# Altium footprint library self_pcblib v1.8.6.PcbLib: 164 footprints (part 9 of 11)
Each footprint in its own frame and in the unit in brackets; x right, y up, seen from the top. Pads: shape width x height; smd on the part's side, far side on the other; paste and mask are expansions set on the pad; w line width, h text height; cw(c..) or ccw(c..) is an arc to the next point about the centre after c.
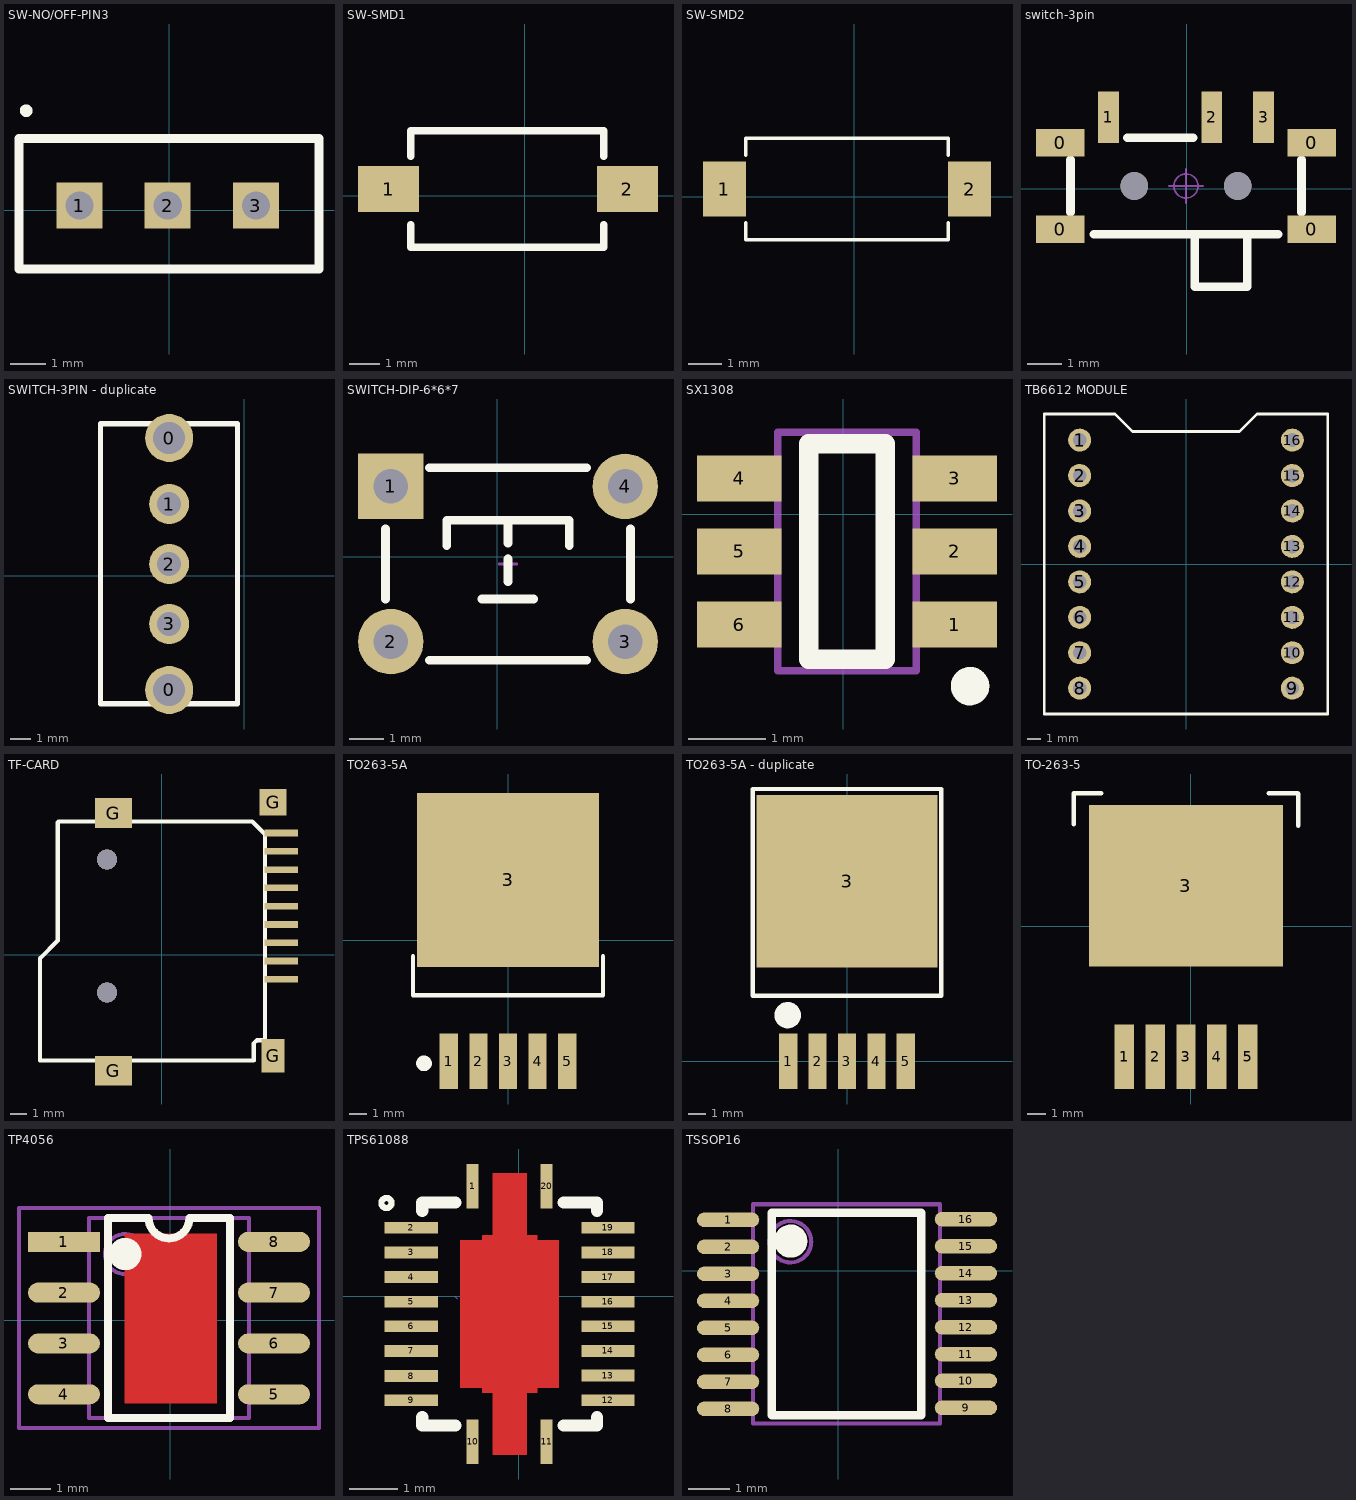
[diagram p8: the footprints below, top view; thin cyan lines are the x and y axes]

## straight-2x5pin [mm]

## SW-NO/OFF-PIN3 [mm]
pads (3):
  rect 1.3x1.3 hole 0.8: 1(-2.547,0.126) 2(-0.047,0.126) 3(2.453,0.126)
Top Overlay:
  circle w0.254: c-4.057,2.814 r0.051
  lines w0.254: -4.26,-1.673 4.24,-1.673 4.24,2.027 -4.26,2.027 -4.26,-1.673
3D body "SW-No_OFF.step": height 4.32, standoff -9.73, extent -5.39,-2.672 5.608,2.916

## SW-SMD1 [mm]
pads (2):
  rect 2x1.5 smd: 1(-4.445,0.229) 2(3.355,0.229)
Top Overlay:
  lines w0.254: -3.72,-0.94 -3.72,-1.671 2.58,-1.671 2.58,-0.94 ; -3.72,1.295 -3.72,2.129 2.58,2.129 2.58,1.295
3D body "SMD按键.STEP": height 2.5, standoff 0, extent -4.504,-1.716 3.386,2.134

## SW-SMD2 [mm]
pads (2):
  rect 1.3x1.651 smd: 1(-3.901,0.235) 2(3.465,0.235)
Top Overlay:
  lines w0.1: -3.266,-0.781 -3.266,-1.289 2.83,-1.289 2.83,-0.781 ; -3.266,1.251 -3.266,1.759 2.83,1.759 2.83,1.251
3D body "按键.STEP": height 1.9, standoff 0, extent -3.518,-1.314 3.082,1.886

## switch-3pin [mm]
pads (9):
  rect 1.4x0.8 smd: 0(-3.675,-1.174) 0(-3.675,1.326) 0(3.625,-1.174) 0(3.625,1.326)
  rect 0.6x1.5 smd: 1(-2.275,2.072) 2(0.725,2.072) 3(2.225,2.072)
  round 0.8 hole 0.8: " "(-1.525,0.076) " "(1.475,0.076)
Top Overlay:
  lines w0.254: -3.375,-0.686 -3.375,0.838 ; -2.692,-1.321 2.642,-1.321 ; -1.724,1.473 0.181,1.473 ; 0.229,-1.324 0.229,-2.845 1.753,-2.845 1.753,-1.324 ; 3.325,-0.686 3.325,0.838
Mechanical 15:
  circle w0.05: c-0.025,0.076 r0.35
  lines w0.05: -0.525,0.076 0.475,0.076 ; -0.025,-0.424 -0.025,0.576
3D body "MSK-12C01-07.STEP": height 1.5, standoff -0.5, extent -3.945,-2.824 3.895,2.476

## SWITCH-3PIN - duplicate [mm] "开关"
pads (5):
  round 2.4 hole 1.6: 0(-3.763,-5.712) 0(-3.763,6.888)
  round 2 hole 1.2: 1(-3.763,3.588) 2(-3.763,0.588) 3(-3.763,-2.412)
Top Overlay:
  lines w0.254: -7.2,-6.4 -0.342,-6.4 -0.342,7.6 -7.2,7.6 -7.2,-6.4
3D body "SW-SLB12814.STEP": height 9.65, standoff -2.6, extent -6.9,-6.4 -0.7,7.6

## SWITCH-DIP-6*6*7 [mm]
pads (4):
  rect 1.9x1.9 hole 1: 1(-3.095,2.047)
  round 1.9 hole 1: 2(-3.095,-2.453) 3(3.705,-2.453) 4(3.705,2.047)
Top Overlay:
  lines w0.254: -3.251,-1.219 -3.251,0.813 ; -1.981,-2.997 2.591,-2.997 ; -1.981,2.591 2.591,2.591 ; -1.473,0.33 -1.473,1.067 2.083,1.067 2.083,0.33 ; -0.457,-1.219 1.041,-1.219 ; 0.305,-0.711 0.305,-0.051 ; 0.305,0.406 0.305,1.067 ; 3.861,-1.219 3.861,0.813
Bottom Overlay:
  lines w0.254: -1.981,-2.489 2.591,-2.489 ; -1.981,2.083 2.591,2.083
Mechanical 15:
  lines w0.076: 0.051,-0.203 0.559,-0.203 ; 0.305,-0.457 0.305,0.051
3D body "TSW DIP-6x6x7.STEP": height 6.95, standoff -3.45, extent -3.801,-3.203 4.411,2.797

## SX1308 [mm]
pads (6):
  rect 1.1x0.6 smd: 1(1.451,-1.433) 2(1.451,-0.483) 3(1.451,0.467) 4(-1.349,0.467) 5(-1.349,-0.483) 6(-1.349,-1.433)
Top Overlay:
  circle w0.25: c1.651,-2.233 r0.125
  lines w0.254: -0.449,-1.883 -0.449,0.917 0.551,0.917 0.551,-1.883 -0.449,-1.883
Mechanical 13:
  lines w0.1: -0.849,-2.033 -0.849,1.067 0.951,1.067 0.951,-2.033 -0.849,-2.033
3D body "User Library-SOT23-6-4.STEP": height 1, standoff -0.1, extent -1.155,-1.933 1.245,0.967

## TB6612 MODULE [mil]
pads (16):
  round 65 hole 39: 1(-300,350) 2(-300,250) 3(-300,150) 4(-300,50) 5(-300,-50) 6(-300,-150) 7(-300,-250) 8(-300,-350) 9(300,-350) 10(300,-250) 11(300,-150) 12(300,-50) 13(300,50) 14(300,150) 15(300,250) 16(300,350)
Top Overlay:
  lines w8: -400,-422.83 400,-422.83 400,423.62 200,423.62 150.79,374.41 -150.79,374.41 -200,423.62 -400,423.62 -400,-422.83

## TF-CARD [mm]
pads (13):
  rect 2x0.4 smd: 1(7.191,-1.488) 2(7.191,-0.388) 3(7.191,0.712) 4(7.191,1.812) 5(7.191,2.912) 6(7.191,4.012) 7(7.191,5.112) 8(7.191,6.212) 9(7.191,7.312)
  rect 2.2x1.8 smd: G(-2.909,-6.988) G(-2.909,8.512)
  rect 1.4x2 smd: G(6.691,-6.088)
  rect 1.6x1.6 smd: G(6.691,9.162)
via -3.309,5.712 diameter 1.2 hole 1.2
via -3.309,-2.288 diameter 1.2 hole 1.2
Top Overlay:
  lines w0.254: -7.329,-6.368 -7.329,-0.226 -6.262,0.841 -6.262,7.953 -6.214,8.001 5.443,8.001 6.205,7.239 6.205,7.112 6.205,-5.153 5.727,-5.153 5.524,-5.356 5.524,-6.372 -7.325,-6.372
3D body "Micro SD.STEP": height 0.1, standoff -2.37, extent -7.227,-7.269 7.983,9.037

## TO263-5A [mm]
pads (6):
  rect 1.05x3.2 smd: 1(-3.425,-6.934) 2(-1.725,-6.934) 3(-0.025,-6.934) 4(1.675,-6.934) 5(3.375,-6.934)
  rect 10.45x10 smd: 3(-0.025,3.48)
Top Overlay:
  circle w0.5: c-4.851,-7.061 r0.2
  lines w0.254: -5.486,-0.897 -5.486,-3.147 5.436,-3.147 5.436,-0.897
3D body "TO263-5A.STEP": height 4.5, standoff 0, extent -5.025,-6.945 4.975,6.383

## TO263-5A - duplicate [mm] "263，5脚晶体管"
pads (6):
  rect 1.05x3.2 smd: 1(-3.4,0) 2(-1.7,0) 3(0,0) 4(1.7,0) 5(3.4,0)
  rect 10.45x10 smd: 3(0,10.414)
Top Overlay:
  circle w0.762: c-3.429,2.667 r0.381
  lines w0.254: -5.461,3.787 5.461,3.787 5.461,6.037 5.461,15.748 -5.461,15.748 -5.461,6.037 -5.461,3.787
3D body "6.STEP": height 4.5, standoff 0, extent -5.047,0.448 4.953,13.776

## TO-263-5 [mil]
pads (6):
  rect 42x140 smd: 1(-144.6,-282.2) 2(-77.6,-282.2) 3(-10.6,-282.2) 4(56.4,-282.2) 5(123.4,-282.2)
  rect 420x350 smd: 3(-10.6,87.8)
Top Overlay:
  lines w10: -253.6,221.8 -253.6,288.8 -194.6,288.8 ; 168.4,288.8 231.4,288.8 232.4,287.8 232.4,217.8
3D body "TO-263-5.step": height 179.92, standoff -0.39, extent -210.6,-315.41 189.4,261.01

## TP4056 [mm]
pads (8):
  rect 1.8x0.5 smd: 1(-2.65,1.956)
  oval 1.8x0.5 smd: 2(-2.65,0.686) 3(-2.65,-0.584) 4(-2.65,-1.854) 5(2.6,-1.854) 6(2.6,-0.584) 7(2.6,0.686) 8(2.6,1.956)
Top Layer:
  rectangle: -1.143,-2.083 1.168,2.159
Top Overlay:
  circle w0.5: c-1.12,1.651 r0.155
  lines w0.2: -1.549,2.551 -1.549,-2.449 1.499,-2.449 1.499,2.551
  lines w0.203: -1.549,2.551 -0.533,2.551 ccw(c-0.025,2.551) -0.025,2.043 ccw(c-0.025,2.551) 0.483,2.551 1.499,2.551
Mechanical 13:
  circle w0.1: c-1.125,1.651 r0.5
  lines w0.1: -2.025,-2.449 1.975,-2.449 1.975,2.551 -2.025,2.551 -2.025,-2.449
Mechanical 15:
  circle w0.05: c-0.025,0.051 r0.35
  lines w0.05: -0.525,0.051 0.475,0.051 ; -0.025,-0.449 -0.025,0.551
  lines w0.1: -3.775,-2.699 3.725,-2.699 3.725,2.801 -3.775,2.801 -3.775,-2.699
3D body "SOP8.STEP": height 1.9, standoff 0, extent -3.029,-2.449 2.978,2.551

## TPS61088 [mm] "12V升压IC"
pads (21):
  rect 0.244x0.914 smd: 1(-0.948,2.27) 10(-0.948,-3) 11(0.576,-3) 20(0.576,2.27)
  rect 1.1x0.244 smd: 2(-2.213,1.413) 3(-2.213,0.905) 4(-2.213,0.397) 5(-2.213,-0.111) 6(-2.213,-0.619) 7(-2.213,-1.127) 8(-2.213,-1.645) 9(-2.213,-2.143) 12(1.841,-2.143) 13(1.841,-1.635) 14(1.841,-1.127) 15(1.841,-0.619) 16(1.841,-0.111) 17(1.841,0.397) 18(1.841,0.905) 19(1.841,1.413)
  round 0 smd: 21(-0.185,-0.363)
Top Layer:
  region: 0.165,2.537 0.165,1.258 0.379,1.255 0.38,1.159 0.83,1.158 0.83,-1.889 0.385,-1.886 0.385,-1.984 0.165,-1.987 0.165,-3.263 -0.535,-3.263 -0.535,-1.984 -0.747,-1.987 -0.747,-1.889 -1.2,-1.889 -1.202,1.159 -0.753,1.159 -0.753,1.257 -0.535,1.256 -0.535,2.537
Top Overlay:
  circle w0.129: c-2.725,1.923 r0.104
  lines w0.254: -1.986,-2.496 -1.986,-2.665 -1.301,-2.665 ; -1.986,1.766 -1.986,1.935 -1.301,1.935 ; 0.929,-2.665 1.614,-2.665 1.614,-2.496 ; 0.929,1.935 1.614,1.935 1.614,1.766
Top Paste:
  region: 0.165,2.537 0.165,1.258 0.379,1.255 0.38,1.159 0.83,1.158 0.83,-1.889 0.385,-1.886 0.385,-1.984 0.165,-1.987 0.165,-3.263 -0.535,-3.263 -0.535,-1.984 -0.747,-1.987 -0.747,-1.889 -1.2,-1.889 -1.202,1.159 -0.753,1.159 -0.753,1.257 -0.535,1.256 -0.535,2.537
Top Solder:
  region: 0.165,2.537 0.165,1.258 0.379,1.255 0.38,1.159 0.83,1.158 0.83,-1.889 0.385,-1.886 0.385,-1.984 0.165,-1.987 0.165,-3.263 -0.535,-3.263 -0.535,-1.984 -0.747,-1.987 -0.747,-1.889 -1.2,-1.889 -1.202,1.159 -0.753,1.159 -0.753,1.257 -0.535,1.256 -0.535,2.537
Mechanical 15:
  lines w0.003: -1.317,-0.003 -1.266,-0.054
3D body "User Library-VQFN-20-2.STEP": height 0.95, standoff -0.05, extent -1.96,-2.65 1.56,1.87

## TSSOP16 [mm]
pads (16):
  oval 1.5x0.35 smd: 1(-2.647,1.223) 2(-2.647,0.573) 3(-2.647,-0.077) 4(-2.647,-0.727) 5(-2.647,-1.377) 6(-2.647,-2.027) 7(-2.647,-2.677) 8(-2.647,-3.327) 9(3.079,-3.303) 10(3.079,-2.653) 11(3.079,-2.011) 12(3.079,-1.361) 13(3.079,-0.711) 14(3.079,-0.061) 15(3.079,0.589) 16(3.079,1.239)
Top Overlay:
  circle w0.4: c-1.14,0.711 r0.2
  lines w0.2: -1.597,-3.48 -1.597,1.398 2.003,1.398 2.003,-3.48 -1.597,-3.48
Mechanical 13:
  circle w0.1: c-1.147,0.698 r0.5
  lines w0.1: -2.047,-3.683 -2.047,1.598 2.453,1.598 2.453,-3.683 -2.047,-3.683
3D body "User Library-TSSOP-16-1.STEP": height 1.1, standoff 0, extent -3.022,-3.552 3.378,1.448